# Altium footprint library xialeste-20221209.PcbLib: 113 footprints (part 1 of 8)
Each footprint in its own frame and in the unit in brackets; x right, y up, seen from the top. Pads: shape width x height; smd on the part's side, far side on the other; paste and mask are expansions set on the pad; w line width, h text height; cw(c..) or ccw(c..) is an arc to the next point about the centre after c.
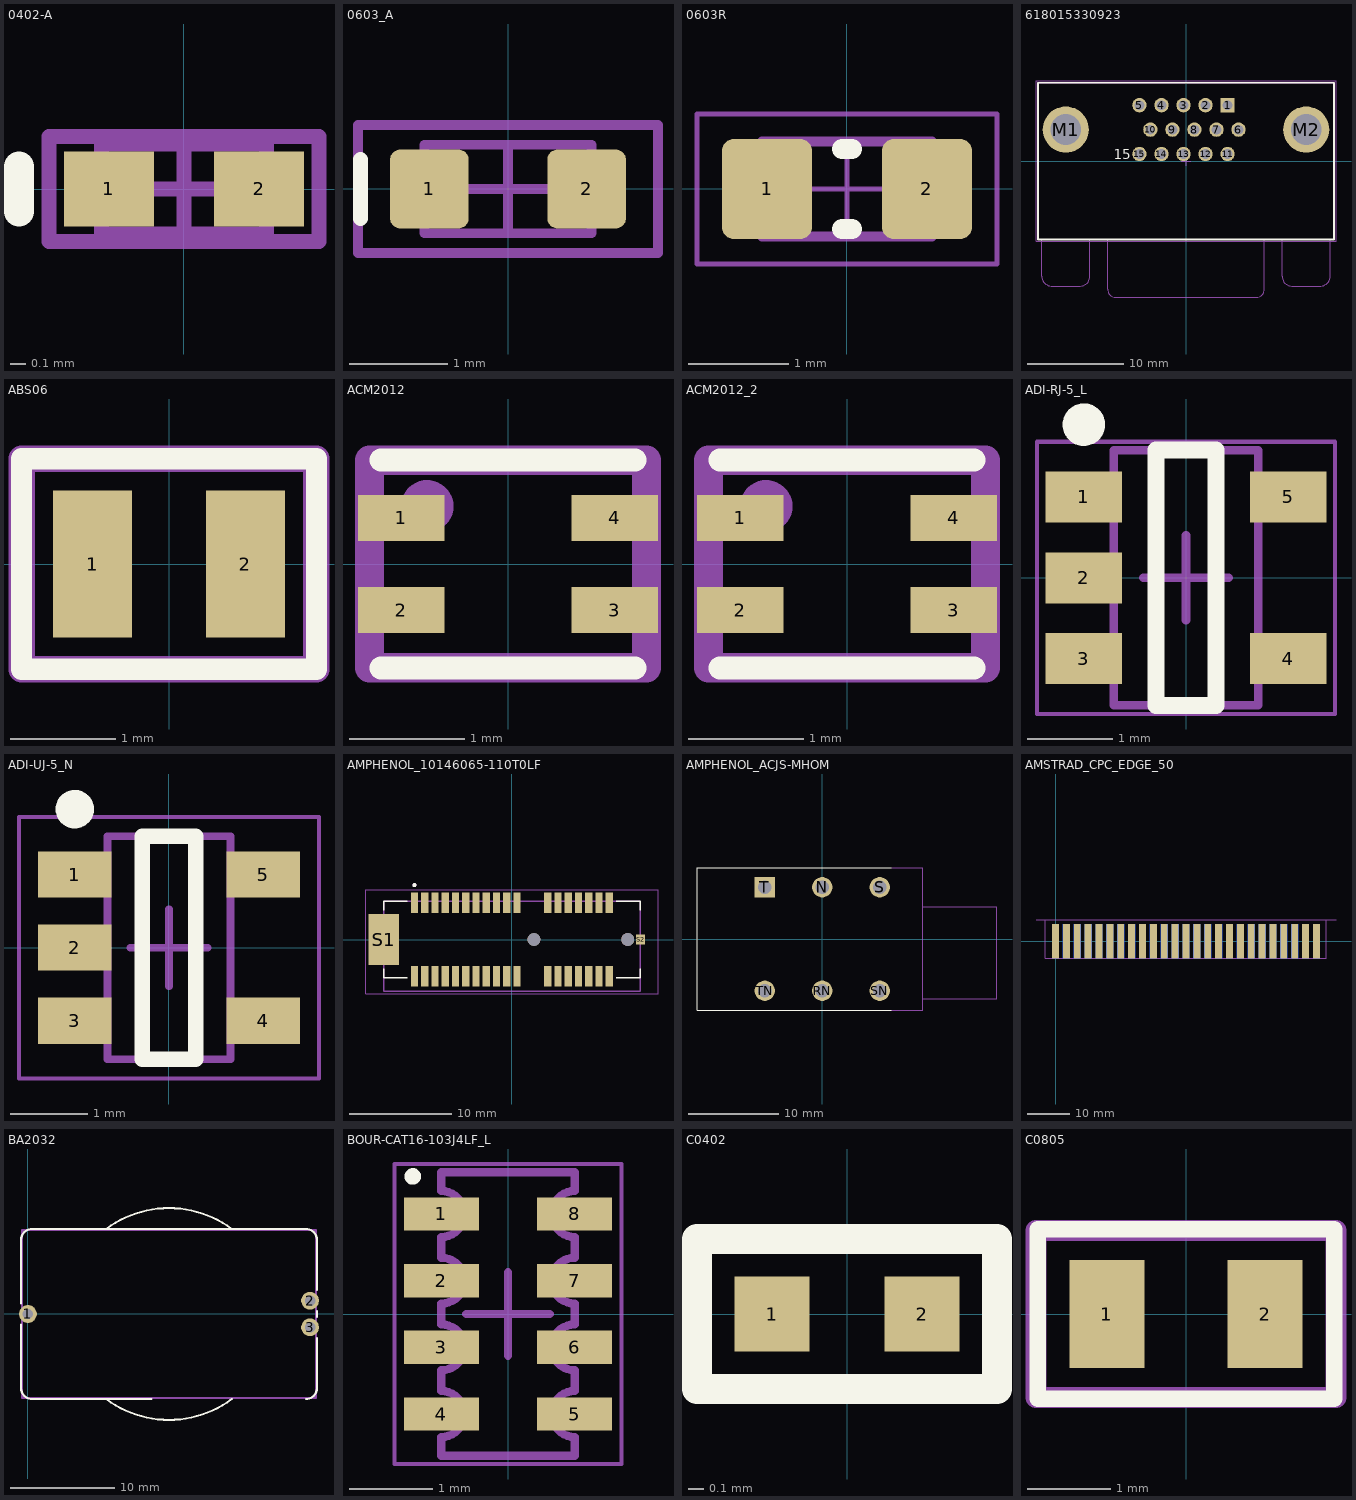
[diagram p0: the footprints below, top view; thin cyan lines are the x and y axes]

## 0402-A [mm] "Chip Inductor, Body 1.0x0.5mm, IPC High Density"
height 0.55
pads (2):
  rect 0.6x0.5 smd: 1(-0.5,0) 2(0.5,0)
Top Overlay:
  lines w0.2: -1.1,-0.15 -1.1,0.15
Mechanical 13:
  lines w0.1: -0.55,-0.3 0.55,-0.3 0.55,0.3 -0.55,0.3 -0.55,-0.3
Mechanical 15:
  lines w0.1: -0.3,0 0.3,0 ; 0,-0.3 0,0.3 ; -0.9,-0.35 0.9,-0.35 0.9,0.35 -0.9,0.35 -0.9,-0.35
3D body: height 0.55, standoff 0, extent -0.55,-0.3 0.55,0.3

## 0603_A [mm] "Chip LED, 2-Leads, Body 1.6x0.8mm, IPC Medium Density"
height 0.68
pads (2):
  rrect25% 0.8x0.8 smd: 1(-0.8,0) 2(0.8,0)
Top Overlay:
  lines w0.15: -1.5,-0.3 -1.5,0.3
Mechanical 13:
  lines w0.1: -0.85,-0.45 0.85,-0.45 0.85,0.45 -0.85,0.45 -0.85,-0.45
Mechanical 15:
  lines w0.1: -0.45,0 0.45,0 ; 0,-0.45 0,0.45 ; -1.525,-0.65 1.525,-0.65 1.525,0.65 -1.525,0.65 -1.525,-0.65
3D body "WL-SMCW_0603_LED.stp": height 0.7, standoff 0, extent -0.8,-0.4 0.8,0.4

## 0603R [mm] "Chip Resistor, Body 1.6x0.8mm, IPC Medium Density"
height 0.6
pads (2):
  rrect25% 0.9x1 smd: 1(-0.8,0) 2(0.8,0)
Top Overlay:
  lines w0.2: -0.05,-0.4 0.05,-0.4 ; -0.05,0.4 0.05,0.4
Mechanical 13:
  lines w0.1: -0.85,-0.475 -0.85,0.475 0.85,0.475 0.85,-0.475 -0.85,-0.475
Mechanical 15:
  lines w0.05: -0.475,0 0.475,0 ; 0,-0.475 0,0.475 ; -1.5,-0.75 -1.5,0.75 1.5,0.75 1.5,-0.75 -1.5,-0.75
3D body: height 0.6, standoff 0, extent 0.581,-0.474 0.85,0.475
3D body: height 0.6, standoff 0, extent -0.58,-0.474 0.581,0.475
3D body: height 0.6, standoff 0, extent -0.849,-0.474 -0.58,0.475

## 618015330923 [mm] "15 pins, right angled"
height 12.5
pads (17):
  rect 1.5x1.5 hole 1: 1(4.32,5.82)
  round 1.5 hole 1: 2(2.03,5.82) 3(-0.26,5.82) 4(-2.55,5.82) 5(-4.84,5.82) 6(5.46,3.28) 7(3.17,3.28) 8(0.88,3.28) 9(-1.41,3.28) 10(-3.7,3.28) 11(4.32,0.74) 12(2.03,0.74) 13(-0.26,0.74) 14(-2.55,0.74) 15(-4.84,0.74)
  round 4.8 hole 3.2: M1(-12.5,3.28) M2(12.5,3.28)
Top Overlay:
  lines w0.2: -15.4,-8.15 15.4,-8.15 15.4,8.15 -15.4,8.15 -15.4,-8.15
  text "15" at -7.5,0.2 h1.02
Top 3D Body:
  lines w0.1: -15.4,-8.15 15.4,-8.15
  text "PCB Edge" at -3.4,-9.62 h1.02
Mechanical 13:
  lines w0.1: -15,-8.15 -15,-11.99 ccw(c-14,-11.99) -14,-12.99 -11,-12.99 ccw(c-11,-11.99) -10,-11.99 -10,-8.15 ; -8.15,-8.15 -8.15,-13.35 ccw(c-7.35,-13.35) -7.35,-14.15 7.35,-14.15 ccw(c7.35,-13.35) 8.15,-13.35 8.15,-8.15 ; 10,-8.15 10,-11.99 ccw(c11,-11.99) 11,-12.99 14,-12.99 ccw(c14,-11.99) 15,-11.99 15,-8.15 ; -15.4,-8.15 -15.4,8.15 15.4,8.15 15.4,-8.15 -15.4,-8.15
Mechanical 15:
  lines w0.05: -0.5,0 0.5,0 ; 0,-0.5 0,0.5 ; -15.6,-8.35 15.6,-8.35 15.6,8.35 -15.6,8.35 -15.6,-8.35
3D body "618015330923.stp": height 12.55, standoff -3.95, extent -15.4,-14.15 15.4,8.15

## ABS06 [mm]
pads (2):
  rect 0.75x1.4 smd: 1(-0.725,0) 2(0.725,0)
Top Overlay:
  lines w0.2: -1.4,-1 -1.4,0 -1.4,1 1.4,1 1.4,-1 -1.4,-1
Mechanical 29:
  lines w0.254: -1.4,-1 1.4,-1 1.4,1 -1.4,1 -1.4,-1
  text ".Designator" at -0.5,-0.3 h0.6
3D body "ABS06.STEP": height 0.6, standoff 0, extent -1,-0.62 1,0.6
3D body: height 0.61, standoff 0.5, extent -0.825,-0.36 0.825,0.34

## ACM2012 [mm]
pads (4):
  rect 0.75x0.4 smd mask+0.076: 1(-0.925,0.4) 2(-0.925,-0.4) 3(0.925,-0.4) 4(0.925,0.4)
Top Overlay:
  lines w0.2: -1.1,-0.9 1.1,-0.9 ; -1.1,0.9 1.1,0.9
Mechanical 29:
  circle w0.254: c-0.7,0.5 r0.1
  lines w0.254: -1.2,-0.9 -1.2,0.9 1.2,0.9 1.2,-0.9 -1.2,-0.9
  text ".Designator" at 0.3,0.1 h0.4
3D body "ACM2012-2P.X_T": height 1.3, standoff 0, extent -1,-0.6 1,0.6

## ACM2012_2 [mm]
pads (4):
  rect 0.75x0.4 smd mask+0.076: 1(-0.925,0.4) 2(-0.925,-0.4) 3(0.925,-0.4) 4(0.925,0.4)
Top Overlay:
  lines w0.2: -1.1,-0.9 1.1,-0.9 ; -1.1,0.9 1.1,0.9
Mechanical 29:
  circle w0.254: c-0.7,0.5 r0.1
  lines w0.254: -1.2,-0.9 1.2,-0.9 1.2,0.9 -1.2,0.9 -1.2,-0.9
  text ".Designator" at 0.3,0.1 h0.4
3D body "ACM2012-2P.X_T": height -0.4, standoff -1.7, extent -1,-0.6 1,0.6

## ADI-RJ-5_L [mm] "SOT-23, 5-Leads, Body 2.9x1.6mm, Pitch 0.95mm, IPC High Density"
height 1.45
pads (5):
  rect 0.9x0.6 smd: 1(-1.2,0.95) 2(-1.2,0) 3(-1.2,-0.95) 4(1.2,-0.95) 5(1.2,0.95)
Top Overlay:
  circle w0.25: c-1.2,1.8 r0.125
  lines w0.2: -0.35,-1.5 -0.35,1.5 0.35,1.5 0.35,-1.5 -0.35,-1.5
Mechanical 13:
  lines w0.1: -0.85,-1.5 0.85,-1.5 0.85,1.5 -0.85,1.5 -0.85,-1.5
Mechanical 15:
  lines w0.05: -1.75,-1.6 1.75,-1.6 1.75,1.6 -1.75,1.6 -1.75,-1.6
  lines w0.1: -0.5,0 0.5,0 ; 0,-0.5 0,0.5
3D body "SOT23-5.step": height 1.1, standoff 0, extent -1.25,-1.5 1.25,1.5

## ADI-UJ-5_N [mm] "SOT23, 5-Leads, Body 2.9x1.6mm, Pitch 0.95mm, IPC Medium Density"
height 1
pads (5):
  rect 0.95x0.6 smd: 1(-1.225,0.95) 2(-1.225,0) 3(-1.225,-0.95) 4(1.225,-0.95) 5(1.225,0.95)
Top Overlay:
  circle w0.25: c-1.225,1.8 r0.125
  lines w0.2: -0.35,-1.45 -0.35,1.45 0.35,1.45 0.35,-1.45 -0.35,-1.45
Mechanical 13:
  lines w0.1: -0.8,-1.45 0.8,-1.45 0.8,1.45 -0.8,1.45 -0.8,-1.45
Mechanical 15:
  lines w0.05: -1.95,-1.7 1.95,-1.7 1.95,1.7 -1.95,1.7 -1.95,-1.7
  lines w0.1: -0.5,0 0.5,0 ; 0,-0.5 0,0.5
3D body "SOT23-5.step": height 1.1, standoff 0, extent -1.25,-1.5 1.25,1.5

## AMPHENOL_10146065-110T0LF [mm]
pads (40):
  rect 0.7x2 smd: A1(-9.5,3.6) A2(-8.5,3.6) A3(-7.5,3.6) A4(-6.5,3.6) A5(-5.5,3.6) A6(-4.5,3.6) A7(-3.5,3.6) A8(-2.5,3.6) A9(-1.5,3.6) A10(-0.5,3.6) A11(0.5,3.6) A12(3.5,3.6) A13(4.5,3.6) A14(5.5,3.6) A15(6.5,3.6) A16(7.5,3.6) A17(8.5,3.6) A18(9.5,3.6) B1(-9.5,-3.6) B2(-8.5,-3.6) B3(-7.5,-3.6) B4(-6.5,-3.6) B5(-5.5,-3.6) B6(-4.5,-3.6) B7(-3.5,-3.6) B8(-2.5,-3.6) B9(-1.5,-3.6) B10(-0.5,-3.6) B11(0.5,-3.6) B12(3.5,-3.6) B13(4.5,-3.6) B14(5.5,-3.6) B15(6.5,-3.6) B16(7.5,-3.6) B17(8.5,-3.6) B18(9.5,-3.6)
  rect 3x5 smd: S1(-12.5,0)
  rect 0.889x1 smd paste-1 mask+0: S2(12.555,0)
  round 1.25 hole 1.25 unplated: ""(2.15,0) ""(11.3,0)
Top Overlay:
  circle w0.2: c-9.5,5.3 r0.1
  lines w0.127: -12.5,-2.85 -12.5,-3.75 -10.2,-3.75 ; -12.5,2.85 -12.5,3.75 -10.2,3.75 ; 10.2,-3.75 12.5,-3.75 12.5,-2.85 ; 10.2,3.75 12.5,3.75 12.5,2.85
Mechanical 13:
  circle w0.2: c-9.5,5.3 r0.1
  lines w0.127: -12.5,-5.05 12.5,-5.05 12.5,3.75 -12.5,3.75 -12.5,-5.05
Mechanical 15:
  lines w0.05: -14.25,-5.3 14.25,-5.3 14.25,4.85 -14.25,4.85 -14.25,-5.3
3D body "step_temp.STEP": height 11.25, standoff -0.62, extent -13.538,-5.108 13.462,4.092

## AMPHENOL_ACJS-MHOM [mm]
pads (6):
  round 2.25 hole 1.5: N(0,5.715) RN(0,-5.715) S(6.35,5.715) SN(6.35,-5.715) TN(-6.35,-5.715)
  rect 2.25x2.25 hole 1.5: T(-6.35,5.715)
Top Overlay:
  lines w0.127: 7.62,-7.874 -13.843,-7.874 -13.843,7.874 7.62,7.874
Mechanical 13:
  lines w0.127: 7.62,-7.874 11.1,-7.874 11.1,-6.604 ; 7.62,7.874 11.1,7.874 11.1,3.556 ; 11.1,-6.604 19.304,-6.604 19.304,3.556 11.1,3.556 ; 11.1,-6.604 11.1,3.556
3D body "ACJS-PHOP.stp": height 12.7, standoff -3.2, extent -13.729,-7.876 19.571,7.874

## AMSTRAD_CPC_EDGE_50 [mm] "The Amstrad CPC 50 pins card esge connector"
pads (50):
  rect 1.6x8 smd paste+0 mask+0: 1(60.96,0) 3(58.42,0) 5(55.88,0) 7(50.8,0) 9(48.26,0) 11(45.72,0) 13(43.18,0) 15(40.64,0) 17(38.1,0) 19(35.56,0) 21(33.02,0) 23(30.48,0) 25(27.94,0) 27(25.4,0) 29(22.86,0) 31(20.32,0) 33(17.78,0) 35(15.24,0) 37(12.7,0) 39(10.16,0) 41(7.62,0) 43(5.08,0) 45(2.54,0) 47(0,0) 49(53.34,0)
  rect 1.6x8 smd far side paste+0 mask+0: 2(60.96,0) 4(58.42,0) 6(55.88,0) 8(50.8,0) 10(48.26,0) 12(45.72,0) 14(43.18,0) 16(40.64,0) 18(38.1,0) 20(35.56,0) 22(33.02,0) 24(30.48,0) 26(27.94,0) 28(25.4,0) 30(22.86,0) 32(20.32,0) 34(17.78,0) 36(15.24,0) 38(12.7,0) 40(10.16,0) 42(7.62,0) 44(5.08,0) 46(2.54,0) 48(0,0) 50(53.34,0)
Bottom Overlay:
  text "25" at -0.762,5.842 h1.52
  text "1" at 60.452,5.842 h1.52
Mechanical 1:
  lines w0.254: -4.568,5.08 65.532,5.08 ; -2.413,-4 63.246,-4 ; -2.413,-3.937 -2.413,5 63.3,5 63.3,-3.937

## BA2032 [mm] "Creator MM. Wrong 3D model."
height 6.7
pads (3):
  round 1.7 hole 1: 1(0,0) 2(26.9,1.27) 3(26.9,-1.27)
Top Overlay:
  lines w0.2: -0.65,-1 -0.65,-7.1 ccw(c0.375,-7.075) 0.4,-8.1 11.8,-8.1 ; -0.65,1 -0.65,7.1 cw(c0.375,7.075) 0.4,8.1 26.5,8.1 cw(c26.525,7.075) 27.55,7.1 27.55,2.3 ; 7.45,-8.1 ccw(c13.45,-0.1) 19.45,-8.1 ; 7.45,8.1 cw(c13.45,0.1) 19.45,8.1 ; 26.5,-8.1 ccw(c26.525,-7.075) 27.55,-7.1 27.55,-2.3 ; 27.55,-0.3 27.55,0.3
Mechanical 29:
  lines w0.2: -0.55,-8 -0.55,8 27.45,8 27.45,-8 -0.55,-8
  text ".Designator" at 13,2.1 h1
3D body "BA2032--3DModel-STEP-1.STEP": height 6.75, standoff -3.4, extent -0.55,-8 27.45,8

## BOUR-CAT16-103J4LF_L [mm] "Chip Array, 8-Leads, Body 3.4x1.6mm, Pitch 0.8mm, IPC High Density"
height 0.6
pads (8):
  rect 0.9x0.4 smd: 1(-0.8,1.2) 2(-0.8,0.4) 3(-0.8,-0.4) 4(-0.8,-1.2) 5(0.8,-1.2) 6(0.8,-0.4) 7(0.8,0.4) 8(0.8,1.2)
Top Overlay:
  circle w0.1: c-1.143,1.651 r0.05
Mechanical 13:
  lines w0.1: -0.8,-1.7 0.8,-1.7 0.8,-1.475 cw(c0.8,-1.2) 0.8,-0.925 0.8,-0.675 cw(c0.8,-0.4) 0.8,-0.125 0.8,0.125 cw(c0.8,0.4) 0.8,0.675 0.8,0.925 cw(c0.8,1.2) 0.8,1.475 0.8,1.7 -0.8,1.7 -0.8,1.475 cw(c-0.8,1.2) -0.8,0.925 -0.8,0.675 cw(c-0.8,0.4) -0.8,0.125 -0.8,-0.125 cw(c-0.8,-0.4) -0.8,-0.675 -0.8,-0.925 cw(c-0.8,-1.2) -0.8,-1.475 -0.8,-1.7
Mechanical 15:
  lines w0.05: -1.36,-1.8 1.36,-1.8 1.36,1.8 -1.36,1.8 -1.36,-1.8
  lines w0.1: -0.5,0 0.5,0 ; 0,-0.5 0,0.5
3D body "CAC-80P319X155-8L.step": height 0.6, standoff 0, extent -0.95,-1.7 0.95,1.7

## C0402 [mm]
pads (2):
  rect 0.5x0.5 smd: 1(-0.5,0) 2(0.5,0)
Top Overlay:
  lines w0.2: -1,-0.5 -1,0.5 1,0.5 1,-0.5 -1,-0.5
Mechanical 29:
  lines w0.15: -1,-0.5 -1,0.5 1,0.5 1,-0.5 -1,-0.5
  text ".Designator" at -0.8,-0.2 h0.4
3D body "CAPC1005X56N EIA 0402.step": height 0.56, standoff 0, extent -0.5,-0.25 0.5,0.25

## C0805 [mm]
pads (2):
  rect 0.9x1.3 smd: 1(-0.95,0) 2(0.95,0)
Top Overlay:
  lines w0.2: -1.778,-1.016 -1.778,1.016 1.778,1.016 1.778,-1.016 -1.778,-1.016
Mechanical 29:
  lines w0.254: -1.8,-1 -1.8,1 1.8,1 1.8,-1 -1.8,-1
  text ".Designator" at -1,-0.3 h0.6
3D body "CAPC2012X95N EIA 0805.step": height 1.5, standoff 0.55, extent -1,-0.6 1,0.6
3D body "CAPC2012X95N EIA 0805.step": height 0.95, standoff 0, extent -1,-0.6 1,0.6